# Altium schematic symbol library Schlib.SchLib: 725 symbols (part 1 of 6) (continued)
## 9774060243R
designator RST?  (value not drawn)
Spacer Material: Steel, Tin-Plated Mounting: SMT Series: WA-SMST Thread D: M2; Manufacturer: Wurth Electronics; Manufacturer Part Number: 9774060243R; Plating: Tin; Threaded/Unthreaded: Threaded; Outside Diameter: 0.171inch; Thread Size: M2X0.4; Supplier: Rs; Supplier Part Number: 1768217P; RoHS: Yes; Category: Spacers, Standoffs; Stock: 2290; Pricing: 20=0.59500, 50=0.56700, 100=0.49000, 250=0.46500 (GBP); Material: Steel; Series: WA-SMSI; Length: 0.291inch; ComponentLink1URL: http://www.farnell.com/datasheets/1960376.pdf?src-supplier=Farnell; ComponentLink1Description: http://www.farnell.com/datasheets/1960376.pdf?src-supplier=Farnell; ComponentLink2URL: http://www.mouser.com/ds/2/445/9774060243R-611459.pdf?src-supplier=Mouser; ComponentLink2Description: http://www.mouser.com/ds/2/445/9774060243R-611459.pdf?src-supplier=Mouser; ComponentLink3URL: https://media.digikey.com/pdf/Data%20Sheets/Wurth%20Electronics%20PDFs/WA-SMSx_Performance_Flyer.pdf?src-supplier=Digi-Key; ComponentLink3Description: https://media.digikey.com/pdf/Data%20Sheets/Wurth%20Electronics%20PDFs/WA-SMSx_Performance_Flyer.pdf?src-supplier=Digi-Key; ComponentLink4URL: http://www.farnell.com/datasheets/1960376.pdf?src-supplier=Element14; ComponentLink4Description: http://www.farnell.com/datasheets/1960376.pdf?src-supplier=Element14; ComponentLink5URL: http://www.farnell.com/datasheets/1960376.pdf?src-supplier=Newark; ComponentLink5Description: http://www.farnell.com/datasheets/1960376.pdf?src-supplier=Newark
footprint RST_6mm- M2
pins: 1

## 9774060360R
designator RST?  (value not drawn)
Spacer Material: Steel, Tin-Plated Mounting: SMT Series: WA-SMSI Thread D: M3 / Round Standoff Threaded M3x0.5 Steel 0.236" (6.00mm); Manufacturer: Wurth Electronics; Manufacturer Part Number: 9774060360R; Plating: Tin; Outside Diameter: 0.236inch; Body Length: 6mm; Supplier: Rs; Supplier Part Number: 1768264P; RoHS: Yes; Category: Spacers, Standoffs; Stock: 835; Pricing: 25=1.72400, 50=1.64600, 100=1.56600, 250=1.48600 (GBP); Mounting Technology: External; Material: Steel; Threaded/Unthreaded: Threaded; Series: WA-SMSI; Length: 0.291inch; Width: 6mm; Thread Size: M3; ComponentLink1URL: https://datasheet.ciiva.com/46421/1840149-46421900.pdf?src-supplier=Element14; ComponentLink1Description: https://datasheet.ciiva.com/46421/1840149-46421900.pdf?src-supplier=Element14
footprint RST_6mm
pins: 1

## 9774065151R
designator RST?  (value not drawn)
WA-SMSI SMT Steel Spacer, M2.5 Internal non Stop; Manufacturer: Wurth Electronics; Manufacturer Part Number: 9774065151R; Supplier: Digikey; Supplier Part Number: 732-9774065151RCT-ND; RoHS: No; Category: Spacers, Standoffs; Stock: 1071; Pricing: 1=1.02, 50=0.919, 100=0.856 (USD)
footprint RST_6.5mm- M2
pins: 1

## 61300211121
designator J?  (value not drawn)
Connector Header Through Hole 2 position 0.100 (2.54mm); MF: Wurth Elektronik; MP: 61300211121; SnapEDA_Link: https://www.snapeda.com/parts/61300211121/Wurth+Elektronik/view-part/?ref=snap; Package: None; Value: *; Check_prices: https://www.snapeda.com/parts/61300211121/Wurth+Elektronik/view-part/?ref=eda; Manufacturer Part Number: 61300211121
footprint 61300211121
pins: 01, 02

## 61300411121
designator J?  (value not drawn)
Connector Header Through Hole 4 position 0.100 (2.54mm); MF: Wurth Electronics; MP: 61300411121; Package: None; Price: None; Value: *; SnapEDA_Link: https://www.snapeda.com/parts/61300411121/Wurth+Electronics+Inc./view-part/?ref=snap; Availability: In Stock; Check_prices: https://www.snapeda.com/parts/61300411121/Wurth+Electronics+Inc./view-part/?ref=eda
footprint 61300411121
pins: 1, 2, 3, 4

## 61300511121
designator J?  (value not drawn)
THT Vertical Pin Header WR-PHD, Pitch 2.54 mm, Single Row, 5 pins; Manufacturer: Wurth Electronics; Manufacturer Part Number: 61300511121; Number of Positions: 5; Gender: Male; Contact Resistance: 20mR; Current Rating: 3A; Operating Supply Voltage: 250V; Pitch: 0.1inch; Supplier: Rs; Supplier Part Number: 8281597; RoHS: Yes; Category: Headers and Wire Housings; Stock: 495; Pricing: 5=0.252, 125=0.136, 500=0.116, 2500=0.11, 5000=0.102 (EUR); Mounting Technology: Through Hole; Contact Plating: Gold; Contact Material: Copper; Color: Black; Min Operating Temperature: -40°C; Max Operating Temperature: 105°C; Number of Rows: 1; Packaging: Bulk; Termination: Solder; Number of Contacts: 5; Series: WR-PHD; Contact Type: Male Pin; Orientation: 5495OrientationType; Voltage Rating: 250V; Height: 8.89mm; Contact Mating Length: 0.236inch; Lead Free: Lead Free; RoHS Compliant: Yes; Reach SVHC Compliant: Unknown; ComponentLink1URL: http://www.farnell.com/cad/1737268.pdf?src-supplier=Element14; ComponentLink1Description: http://www.farnell.com/cad/1737268.pdf?src-supplier=Element14; ComponentLink2URL: https://datasheet.octopart.com/61300511121-W%C3%BCrth-Elektronik-datasheet-21154836.pdf?src-supplier=Element14; ComponentLink2Description: https://datasheet.octopart.com/61300511121-W%C3%BCrth-Elektronik-datasheet-21154836.pdf?src-supplier=Element14; ComponentLink3URL: https://katalog.we-online.de/em/datasheet/6130xx11121.pdf?src-supplier=Digikey; ComponentLink3Description: https://katalog.we-online.de/em/datasheet/6130xx11121.pdf?src-supplier=Digikey
footprint 61300511121 (Pin Header, pitch 2.54 mm, THT, Vertical, single row, 5p)
pins: 1, 2, 3, 4, 5

## 61300611121
designator J?  (value not drawn)
THT Vertical Pin Header WR-PHD, Pitch 2.54 mm, Single Row, 6 pins; Manufacturer: Wurth Electronics; Manufacturer Part Number: 61300611121; Current Rating: 3A; Voltage Rating: 250V; Number of Positions: 6; Gender: Male; Contact Resistance: 20mR; Pitch: 0.1inch; Supplier 1: Rs; RoHS: Yes; Category: Headers and Wire Housings; Stock 1: 1345; Pricing 1: 125=0.122, 500=0.118, 2500=0.116, 5000=0.112 (GBP); Mounting Technology: Through Hole; Contact Plating: Gold; Contact Material: Copper Alloy,Copper; Housing Material: PBT; Color: Black; Min Operating Temperature: -40°C; Max Operating Temperature: 125°C; Number of Rows: 1; Contact Gender: Male; Packaging: Bulk; Termination: Through Hole; Number of Contacts: 6; Series: WR-PHD; Contact Type: Male Pin; Operating Supply Voltage: 250V; Orientation: 5495OrientationType; Height: 8.89mm; Contact Mating Length: 0.236inch; Lead Free: Lead Free; RoHS Compliant: Yes; Reach SVHC Compliant: Unknown; ComponentLink1URL: http://www.mouser.com/ds/2/445/6130xx11121-538006.pdf?src-supplier=Mouser; ComponentLink1Description: http://www.mouser.com/ds/2/445/6130xx11121-538006.pdf?src-supplier=Mouser; ComponentLink2URL: http://www.farnell.com/cad/1737268.pdf?src-supplier=Element14; ComponentLink2Description: http://www.farnell.com/cad/1737268.pdf?src-supplier=Element14; ComponentLink3URL: https://datasheet.octopart.com/61300611121-W%C3%BCrth-Elektronik-datasheet-21154836.pdf?src-supplier=Element14; ComponentLink3Description: https://datasheet.octopart.com/61300611121-W%C3%BCrth-Elektronik-datasheet-21154836.pdf?src-supplier=Element14; ComponentLink4URL: https://katalog.we-online.de/em/datasheet/6130xx11121.pdf?src-supplier=Digi-Key; ComponentLink4Description: https://katalog.we-online.de/em/datasheet/6130xx11121.pdf?src-supplier=Digi-Key; Supplier Part Number 1: 8281591P
footprint 61300611121
pins: 1, 2, 3, 4, 5, 6

## 61900411121
designator J?  (value not drawn)
4 Positions Header, Unshrouded Connector 0.100" (2.54mm) Through Hole Tin; Manufacturer: Wurth Electronics; Manufacturer Part Number: 61900411121; Current Rating: 3A; Voltage Rating: 250V; Number of Positions: 4; Insulation: Insulated; Insulation Resistance: 1GR; Gender: Male; Contact Resistance: 20mR; Supplier: Rs; Supplier Part Number: 8281484; RoHS: Yes; Category: Headers and Wire Housings; Stock: 215; Pricing: 5=0.916, 100=0.578, 375=0.548, 1500=0.524, 3000=0.498 (EUR); Mounting Technology: Through Hole; Contact Plating: Tin; Contact Material: Copper Alloy,Copper; Housing Material: Nylon; Contact Shape: Square; Contact Finish - Mating: TIN; Insulation Material: Nylon; Insulation Color: Beige; Min Operating Temperature: -40°C; Max Operating Temperature: 105°C; Number of Rows: 1; Fastening Type: Friction; Packaging: Bulk; Contact Gender: Male; Termination: Through Hole; Number of Contacts: 4; Connector Type: Header; Series: WR-WTB; Contact Type: Male Pin; Operating Supply Voltage: 250V; Orientation: 5495OrientationType; Length: 10.16mm; Width: 10.2mm; Height: 3.3mm; Pitch: 2.54mm; Lead Free: Lead Free; Flammability Rating: UL94 V-0; RoHS Compliant: Yes; Reach SVHC Compliant: Unknown; ComponentLink1URL: https://datasheet.ciiva.com/13678/6190xx11121-265818-13678996.pdf?src-supplier=Mouser; ComponentLink1Description: https://datasheet.ciiva.com/13678/6190xx11121-265818-13678996.pdf?src-supplier=Mouser; ComponentLink2URL: https://datasheet.ciiva.com/738/6190xx11121-738576.pdf?src-supplier=Digikey; ComponentLink2Description: https://datasheet.ciiva.com/738/6190xx11121-738576.pdf?src-supplier=Digikey; ComponentLink3URL: https://datasheet.ciiva.com/7631/1442200-7631333.pdf?src-supplier=Element14; ComponentLink3Description: https://datasheet.ciiva.com/7631/1442200-7631333.pdf?src-supplier=Element14; ComponentLink4URL: https://datasheet.ciiva.com/48700/001088232-da-01-en-wr-wtb-2-54mm-61900411121-48700571.pdf?src-supplier=Conrad; ComponentLink4Description: https://datasheet.ciiva.com/48700/001088232-da-01-en-wr-wtb-2-54mm-61900411121-48700571.pdf?src-supplier=Conrad
footprint 61900411121
pins: 1, 2, 3, 4

## 74279221111
designator FB?
Ferrite Beads Multi-Layer High Current 110Ohm 25% 100MHz 5.4A 0.015Ohm DCR 1206 Automotive T/R; Manufacturer: Wurth Elektronik; Manufacturer Part Number: 74279221111; DC Resistance (DCR): 9.5mΩ; Impedance: 110Ω; Number of Lines: 1; Value: 15mΩ; Supplier: RS; Supplier Part Number: 8630873P; RoHS: Compliant; Category: Ferrite Beads and Chips; Stock: 1470; Pricing: 100=0.324, 500=0.269, 1000=0.257, 3000=0.245 (GBP); Case/Package: 1206; Case Code (Imperial): 1206; Case Code (Metric): 3216; Current Rating: 5.4A; Height: 1.1mm; Length: 3.2mm; Max Current Rating: 5.4A; Max DC Current: 5.4A; Max Operating Temperature: 125°C; Min Operating Temperature: -55°C; Mounting Technology: Surface Mount; Packaging: Tape & Reel (TR); Termination: SMD/SMT; Test Frequency: 100MHz; Tolerance: 25%; Weight: 10.007382mg; Width: 1.6mm; ComponentLink1URL: https://datasheet.octopart.com:443/74279221111-Wurth-Elektronik-datasheet-168487539.pdf?src-supplier=Wurth+Elektronik; ComponentLink1Description: https://datasheet.octopart.com:443/74279221111-Wurth-Elektronik-datasheet-168487539.pdf?src-supplier=Wurth+Elektronik; ComponentLink2URL: https://datasheet.octopart.com:443/74279221111-W%C3%BCrth-Elektronik-datasheet-37143589.pdf?src-supplier=RS+(Formerly+Allied+Electronics); ComponentLink2Description: https://datasheet.octopart.com:443/74279221111-W%C3%BCrth-Elektronik-datasheet-37143589.pdf?src-supplier=RS+(Formerly+Allied+Electronics)
footprint 74279221111
pins: 1, 2

## 74437368100
designator L?  value 10uH  (hidden comment: *)
WE-LHMI; 10000nH; Composite Iron Multilayer SMD Induc.; 1040 Case; .012GHz 5.2A; Manufacturer: Wurth Electronics; Manufacturer Part Number: 74437368100; Core Material: Ferrite,Composite; Saturation Current: 12.5A; Tolerance: 20%; Shielding: Shielded; DC Resistance (DCR): 30mR; Test Frequency: 100kHz; Frequency: 12MHz; Supplier: Rs; Supplier Part Number: 7568639; RoHS: Yes; Category: Fixed Inductors; Stock: 79; Pricing: 1=2.09, 10=2.01, 20=1.92, 50=1.84, 100=1.69 (GBP); Mounting Technology: Surface Mount; Case/Package: Nonstandard; Min Operating Temperature: -40°C; Max Operating Temperature: 125°C; Packaging: Tape and Reel; Max DC Current: 5.2A; Termination: SMD/SMT; Series: WE-LHMI; Package Quantity: 1; Current Rating: 5.2A; Inductance Tolerance: 20%; Self Resonant Frequency: 12MHz; RMS Current (Irms): 5.2A; ESR: 30mR; Length: 11mm; Width: 10mm; Height: 3.8mm; Depth: 10mm; Height - Seated (Max): 0.157inch; RoHS Compliant: Yes; Reach SVHC Compliant: Unknown; ComponentLink1URL: https://datasheet.ciiva.com/7691/1735876-7691599.pdf?src-supplier=Element14; ComponentLink1Description: https://datasheet.ciiva.com/7691/1735876-7691599.pdf?src-supplier=Element14; ComponentLink2URL: https://datasheet.ciiva.com/4961/74437368100-33032-4961278.pdf?src-supplier=Mouser; ComponentLink2Description: https://datasheet.ciiva.com/4961/74437368100-33032-4961278.pdf?src-supplier=Mouser; ComponentLink3URL: https://datasheet.ciiva.com/7354/74437368100-7354467.pdf?src-supplier=Newark; ComponentLink3Description: https://datasheet.ciiva.com/7354/74437368100-7354467.pdf?src-supplier=Newark; ComponentLink4URL: https://datasheet.ciiva.com/1060/74437368100-1060838.pdf?src-supplier=Digikey; ComponentLink4Description: https://datasheet.ciiva.com/1060/74437368100-1060838.pdf?src-supplier=Digikey; ComponentLink5URL: https://datasheet.ciiva.com/48690/001087611-da-01-ml-we-lhmi-smd-speicherdrossel-744373-de-en-48690490.pdf?src-supplier=Conrad; ComponentLink5Description: https://datasheet.ciiva.com/48690/001087611-da-01-ml-we-lhmi-smd-speicherdrossel-744373-de-en-48690490.pdf?src-supplier=Conrad
footprint 74437368100 (Precision Wire Wound Inductor, 2-Leads, Body 10.80x10.16mm, IPC Medium Density)
pins: 1 B, 2 A

## 74438336012
designator L?
Fixed Inductors WE-MAPI SMD 3020 1.2uH 3.9A 36mOhm; Manufacturer: Wurth Elektronik; Manufacturer Part Number: 74438336012; Core Material: Composite, Ferrite, Metal; DC Resistance (DCR): 30mΩ; Value: 1.2µH; Inductance Tolerance: 20%; Saturation Current: 3.05A; Self Resonant Frequency: 57MHz; Shielding: Shielded; Test Frequency: 100kHz; Supplier: RS; Supplier Part Number: 8630801; RoHS: Compliant; Category: Fixed Inductors; Stock: 50; Pricing: 5=1.12, 25=1.064, 50=0.996, 250=0.93, 1000=0.712 (GBP); Ambient Temperature Range High: 85°C; Ambient Temperature Range Low: -40°C; Case/Package: SMD/SMT; Current Rating: 3.9A; Height: 2mm; Height - Seated (Max): 2.0066mm; Length: 3mm; Max DC Current: 3.9A; Max Operating Temperature: 125°C; Min Operating Temperature: -40°C; Mounting Technology: Surface Mount; Pins: 2; REACH SVHC: Unknown; RMS Current (Irms): 3.9A; Termination: SMD/SMT; Tolerance: 20%; Width: 3mm; ComponentLink1URL: https://datasheet.octopart.com:443/74438336012-Wurth-Elektronik-datasheet-168490058.pdf?src-supplier=Wurth+Elektronik; ComponentLink1Description: https://datasheet.octopart.com:443/74438336012-Wurth-Elektronik-datasheet-168490058.pdf?src-supplier=Wurth+Elektronik; ComponentLink2URL: https://datasheet.octopart.com:443/74438336012-W%C3%BCrth-Elektronik-datasheet-32048088.pdf?src-supplier=Newark; ComponentLink2Description: https://datasheet.octopart.com:443/74438336012-W%C3%BCrth-Elektronik-datasheet-32048088.pdf?src-supplier=Newark; ComponentLink3URL: https://datasheet.octopart.com:443/74438336012-W%C3%BCrth-Elektronik-datasheet-111088892.pdf?src-supplier=RS+(Formerly+Allied+Electronics); ComponentLink3Description: https://datasheet.octopart.com:443/74438336012-W%C3%BCrth-Elektronik-datasheet-111088892.pdf?src-supplier=RS+(Formerly+Allied+Electronics)
footprint 74438336012
pins: 1, 2

## 74438336015HT
designator *  value 1.5uH
Power Inductor, 1.5UH, Shielded, 5.2A Rohs Compliant: Yes; Manufacturer: Wurth Elektronik; Manufacturer Part Number: 74438336015HT; Supplier: RS; Supplier Part Number: 219750; Category: Fixed Inductors; Stock: 500; Pricing: 5=1.346, 50=1.278, 100=1.182, 500=1.09, 1000=1.048 (EUR)
footprint 74438336015HT
pins: 1 B, 2 A

## 74438356150
designator L?  value 15uH  (hidden comment: *)
General Purpose Inductor, 15uH, 20%, 1 Element, SMD, 1616; Manufacturer: Wurth Electronics; Manufacturer Part Number: 74438356150; Supplier: Farnell; Supplier Part Number: 2842179; RoHS: Yes; Category: Fixed Inductors; Stock: 719; Pricing: 1=338.96, 50=322.98, 100=299, 250=276.61, 500=257.42, 1000=209.46, 5000=205.28, 10000=201.09 (JPY); ComponentLink1URL: http://www.farnell.com/datasheets/2579563.pdf?src-supplier=Farnell; ComponentLink1Description: http://www.farnell.com/datasheets/2579563.pdf?src-supplier=Farnell; ComponentLink2URL: http://www.farnell.com/datasheets/2579563.pdf?src-supplier=Element14; ComponentLink2Description: http://www.farnell.com/datasheets/2579563.pdf?src-supplier=Element14; ComponentLink3URL: https://katalog.we-online.de/pbs/datasheet/74438356150.pdf?src-supplier=Digikey; ComponentLink3Description: https://katalog.we-online.de/pbs/datasheet/74438356150.pdf?src-supplier=Digikey; ComponentLink4URL: http://www.farnell.com/datasheets/2579563.pdf?src-supplier=Newark; ComponentLink4Description: http://www.farnell.com/datasheets/2579563.pdf?src-supplier=Newark
footprint 74438356150
pins: 1 B, 2 A

## 97730256330R
designator RST?  (value not drawn)
WA-SMSI SMT Steel Spacer, M1.6 Bottom closed; Manufacturer: Wurth Electronics; Manufacturer Part Number: 97730256330R; Supplier: Digikey; Supplier Part Number: 732-13680-1-ND; RoHS: No; Category: Spacers, Standoffs; Stock: 2984; Pricing: 1=0.88, 10=0.81, 50=0.721, 100=0.632, 500=0.588, 1000=0.544 (USD); Min Operating Temperature: -55°C; Max Operating Temperature: 150°C; Packaging: 10Packaging; Length: 2.5mm; Width: 3.3mm; ComponentLink1URL: https://www.we-online.com/catalog/datasheet/97730256330R.pdf?src-supplier=Digikey; ComponentLink1Description: https://www.we-online.com/catalog/datasheet/97730256330R.pdf?src-supplier=Digikey
footprint 97730256330R
pins: 1

## 875105242010
designator C?  value 100uF  (hidden comment: *)
WCAP-PSLP Radial Can - SMD Aluminum Polymer Capacitor 0.197Dia 5.00mm ±20% 100muF 10V; Manufacturer: Wurth Electronics; Manufacturer Part Number: 875105242010; Material: 4242ConductorMaterial; Dissipation Factor: 8%; Leakage Current: 300uA; Pitch: 5.3mm; Supplier: Digikey; Supplier Part Number: 732-6410-1-ND; RoHS: Yes; Category: Polymer Capacitors; Stock: 2301; Pricing: 1=0.6, 50=0.508, 100=0.441, 250=0.392, 500=0.343 (USD); Diameter: 5mm; Length: 5.5mm; Height: 5.5mm; ComponentLink1URL: http://www.farnell.com/datasheets/1880491.pdf?src-supplier=Farnell; ComponentLink1Description: http://www.farnell.com/datasheets/1880491.pdf?src-supplier=Farnell; ComponentLink2URL: http://katalog.we-online.de/pbs/datasheet/875105242010.pdf?src-supplier=Digikey; ComponentLink2Description: http://katalog.we-online.de/pbs/datasheet/875105242010.pdf?src-supplier=Digikey; ComponentLink3URL: https://katalog.we-online.de/pbs/datasheet/875105242010.pdf?src-supplier=Digikey; ComponentLink3Description: https://katalog.we-online.de/pbs/datasheet/875105242010.pdf?src-supplier=Digikey; ComponentLink4URL: http://www.farnell.com/datasheets/1880491.pdf?src-supplier=Newark; ComponentLink4Description: http://www.farnell.com/datasheets/1880491.pdf?src-supplier=Newark; ComponentLink5URL: http://www.farnell.com/datasheets/1880491.pdf?src-supplier=Element14; ComponentLink5Description: http://www.farnell.com/datasheets/1880491.pdf?src-supplier=Element14
footprint 875105242010
pins: 1 B, 2 A

## A768KS567M1CLAE017
designator C?  value 560uF  (hidden comment: *)
Cap Alum Poly 560UF 20% 16V SMD; Manufacturer: KEMET; Manufacturer Part Number: A768KS567M1CLAE017; Supplier: Digi-Key; Supplier Part Number: 399-A768KS567M1CLAE017CT-ND; RoHS: No; Category: Polymer Capacitors; Stock: 776; Pricing: 1=0.98000, 10=0.74500, 50=0.61880, 100=0.53290 (USD)
pins: 1 B, 2 A

## A768MS227M1GLAE022
designator C?  value 220uF  (hidden comment: *)
Cap Aluminum Polymer 220uF 40V 20% Solder Cylindrical 22m Ohm 2200mA 2000 hr 125°C T/R; Manufacturer: KEMET; Manufacturer Part Number: A768MS227M1GLAE022; Supplier: Digi-Key; Supplier Part Number: 399-A768MS227M1GLAE022CT-ND; RoHS: Yes; Category: Polymer Capacitors; Stock: 1465; Pricing: 1=0.97000, 10=0.73900, 50=0.61420, 100=0.52890 (USD)
footprint A768MS227M1GLAE022 (Aluminum Electrolytic Capacitor, Body 10.80x10.30x10.40mm, IPC Low Density)
pins: 1 P, 2 N

## A769KE107M1VLAS031
designator *  value 100 uF
Cap, 100UF, 35V, Alu Elec SMD, Polymer;; Manufacturer: KEMET; Manufacturer Part Number: A769KE107M1VLAS031; Supplier: Digi-Key; Supplier Part Number: 399-A769KE107M1VLAS031CT-ND; RoHS: No; Stock: 3000; Pricing: 1=0.83000, 10=0.61100, 50=0.48920, 100=0.41920, 500=0.33190 (USD)
pins: 1 P, 2 N

## AA3528SECKT09
designator D?  (value not drawn)
3.5X2.8MM Orange SMD Led; Manufacturer: Kingbright; Manufacturer Part Number: AA3528SECKT09; Supplier: Digikey; Supplier Part Number: 754-AA3528SECKT09TR-ND; RoHS: Yes; Category: LEDs; Stock: 13142; Pricing: 1=0.83, 10=0.496, 100=0.3298, 500=0.26448, 1000=0.24444 (USD); ComponentLink1URL: https://www.kingbrightusa.com/images/catalog/SPEC/AA3528SECKT09.pdf; ComponentLink1Description: https://www.kingbrightusa.com/images/catalog/SPEC/AA3528SECKT09.pdf
footprint AA3528SECKT09
pins: 1 C, 2 A

## AA3528ZGCKT09
designator D?  (value not drawn)
3.5X2.8MM Green SMD Led; Manufacturer: Kingbright; Manufacturer Part Number: AA3528ZGCKT09; Supplier: Digikey; Supplier Part Number: 754-AA3528ZGCKT09CT-ND; RoHS: Yes; Category: LEDs; Stock: 13142; Pricing: 1=0.83, 10=0.496, 100=0.3298, 500=0.26448, 1000=0.24444 (USD); ComponentLink1URL: https://datasheet.octopart.com/AA3528ZGCKT09-Kingbright-datasheet-159640635.pdf?src-supplier=Sager+Electronics; ComponentLink1Description: https://datasheet.octopart.com/AA3528ZGCKT09-Kingbright-datasheet-159640635.pdf?src-supplier=Sager+Electronics
footprint AA3528ZGCKT09
pins: 1 C, 2 A

## ABS05-32.768KHZ-T
designator Y?  Frequency: 32.768kHz  (hidden comment: *)
CRYSTAL 32.768kHz ±20ppm Crystal 12.5pF 90 kOhm -40°C ^ 85°C Surface Mount 2-SMD; Manufacturer: Abracon; Manufacturer Part Number: ABS05-32.768KHZ-T; ESR (Equivalent Series Resistance): 90kR; Supplier: Future Electronics; Supplier Part Number: 7024515; RoHS: Yes; Category: Crystals; Stock: 261000; Pricing: 3000=0.415, 6000=0.41, 9000=0.405, 12000=0.4, 15000=0.39 (USD); Mounting Technology: Surface Mount; Case/Package: CSMD; Pins: 2; Min Operating Temperature: -40°C; Max Operating Temperature: 85°C; Packaging: Tape and Reel; Frequency Tolerance: 20ppm; Load Capacitance: 12.5pF; Package Quantity: 3000; Tolerance: 20ppm; Termination: SMD/SMT; ESR: 90kR; Series: ABS05; Operating Frequency: 32.768 kHz; Length: 1.6mm; Width: 1mm; Height: 0.5mm; Depth: 1mm; Radiation Hardening: No; Reach SVHC Compliant: No; Lead Free: Lead Free; RoHS Compliant: Yes; ComponentLink1URL: https://datasheet.ciiva.com/23810/abs05-23810480.pdf?src-supplier=Newark; ComponentLink1Description: https://datasheet.ciiva.com/23810/abs05-23810480.pdf?src-supplier=Newark; ComponentLink2URL: https://datasheet.ciiva.com/6728/abs05-6728949.pdf?src-supplier=Digikey; ComponentLink2Description: https://datasheet.ciiva.com/6728/abs05-6728949.pdf?src-supplier=Digikey; ComponentLink3URL: https://datasheet.ciiva.com/6728/abs05-6728950.pdf?src-supplier=Digikey; ComponentLink3Description: https://datasheet.ciiva.com/6728/abs05-6728950.pdf?src-supplier=Digikey; ComponentLink4URL: https://datasheet.ciiva.com/16411/abs05-16411149.pdf?src-supplier=Future+Electronics; ComponentLink4Description: https://datasheet.ciiva.com/16411/abs05-16411149.pdf?src-supplier=Future+Electronics
footprint ABS05-32.768KHZ-T
pins: 1, 2

## AC0402FR-075R1L
designator R?  value 5.1Ω
Res Thick Film 0402 5.1 Ohm 1% 0.063W(1/16W) ±200ppm/C Pad SMD T/R Automotive AEC-Q200; Manufacturer: Yageo Group; Manufacturer Part Number: AC0402FR-075R1L; Max Power Dissipation: 63mW; Power Dissipation: 62.5mW; Temperature Coefficient: 200ppm/°C; Voltage Rating: 50V; Supplier Part Number: AC0402FR-075R1L; RoHS: Compliant; Category: Chip SMD Resistors; Stock: 210000; Pricing: 10000=0.002 (USD); Case/Package: 0402; China RoHS: Non-Compliant; Composition: Thick Film; Features: Automotive AEC-Q200, Moisture Resistant; Height: 320µm; Length: 990.6µm; Lifecycle Status: Production; Max Operating Temperature: 155°C; Min Operating Temperature: -55°C; Mounting Technology: Surface Mount; Number of Terminals: 2; Number of Terminations: 2; Packaging: Tape & Reel; Power Rating: 62.5mW; REACH SVHC: Yes; Schedule B: 8533210045, 8533210045|8533210045|8533210045|8533210045|8533210045; Tolerance: 1%; Width: 500µm; Working Voltage: 50V; ComponentLink1URL: https://datasheet.octopart.com:443/AC0402FR-075R1L-Yageo-datasheet-182189377.pdf?src-supplier=IHS; ComponentLink1Description: https://datasheet.octopart.com:443/AC0402FR-075R1L-Yageo-datasheet-182189377.pdf?src-supplier=IHS; ComponentLink2URL: https://datasheet.octopart.com:443/AC0402FR-075R1L-Yageo-datasheet-83209224.pdf?src-supplier=Upverter; ComponentLink2Description: https://datasheet.octopart.com:443/AC0402FR-075R1L-Yageo-datasheet-83209224.pdf?src-supplier=Upverter; ComponentLink3URL: https://datasheet.octopart.com:443/AC0402FR-075R1L-Yageo-datasheet-178509465.pdf?src-supplier=Newark; ComponentLink3Description: https://datasheet.octopart.com:443/AC0402FR-075R1L-Yageo-datasheet-178509465.pdf?src-supplier=Newark; ComponentLink4URL: https://datasheet.octopart.com:443/AC0402FR-075R1L-Yageo-datasheet-166720450.pdf?src-supplier=Future+Electronics; ComponentLink4Description: https://datasheet.octopart.com:443/AC0402FR-075R1L-Yageo-datasheet-166720450.pdf?src-supplier=Future+Electronics; ComponentLink5URL: https://datasheet.octopart.com:443/AC0402FR-075R1L-Yageo-Group-datasheet-164768995.pdf?src-supplier=ODG+(Origin+Data+Global); ComponentLink5Description: https://datasheet.octopart.com:443/AC0402FR-075R1L-Yageo-Group-datasheet-164768995.pdf?src-supplier=ODG+(Origin+Data+Global); ComponentLink6URL: https://datasheet.octopart.com/AC0402FR-075R1L-Yageo-datasheet-12512238.pdf; ComponentLink6Description: https://datasheet.octopart.com/AC0402FR-075R1L-Yageo-datasheet-12512238.pdf; ComponentLink7URL: https://datasheet.octopart.com:443/AC0402FR-075R1L-Yageo-datasheet-140571090.pdf?src-supplier=Arrow.cn; ComponentLink7Description: https://datasheet.octopart.com:443/AC0402FR-075R1L-Yageo-datasheet-140571090.pdf?src-supplier=Arrow.cn; ComponentLink8URL: http://sigma.octopart.com:80/conflict_mineral_statement/Yageo-company-3.pdf?src-supplier=Compliance+Statements; ComponentLink8Description: http://sigma.octopart.com:80/conflict_mineral_statement/Yageo-company-3.pdf?src-supplier=Compliance+Statements; ComponentLink9URL: http://sigma.octopart.com:80/rohs_statement/Yageo-company-2.pdf?src-supplier=Compliance+Statements; ComponentLink9Description: http://sigma.octopart.com:80/rohs_statement/Yageo-company-2.pdf?src-supplier=Compliance+Statements; Supplier: Arrow Electronics
footprint R 0402 (1005 Metric) (Chip Capacitor, Body 1.0x0.5mm, IPC High Density)
pins: 1 B, 2 A

## AC0402FR-0752K3L
designator R?  value 52.3kΩ  (hidden comment: *)
Res Thick Film 0402 52.3K Ohm 1% 0.063W(1/16W) ±100ppm/C Pad SMD Automotive T/R; Manufacturer: Yageo Group; Manufacturer Part Number: AC0402FR-0752K3L; Max Power Dissipation: 63mW; Power Dissipation: 62.5mW; Temperature Coefficient: 100ppm/°C; Voltage Rating: 50V; Supplier: Future Electronics; Supplier Part Number: 4184608; RoHS: Compliant; Category: Chip SMD Resistors; Stock: 20000; Pricing: 10000=0.0009, 50000=0.0009, 250000=0.0008, 750000=0.0008, 2000000=0.0008 (USD); Case/Package: 0402; Case Code (Imperial): 0402; Case Code (Metric): 1005; China RoHS: Non-Compliant; Composition: Thick Film; Features: Automotive AEC-Q200, Moisture Resistant; Height: 320µm; Length: 990.6µm; Lifecycle Status: Production; Max Operating Temperature: 155°C; Min Operating Temperature: -55°C; Mounting Technology: Surface Mount; Number of Terminals: 2; Number of Terminations: 2; Packaging: Tape & Reel; Power Rating: 62.5mW; REACH SVHC: Yes; Schedule B: 8533210045, 8533210045|8533210045|8533210045|8533210045|8533210045; Termination: SMD/SMT; Tolerance: 1%; Weight: 652.039032µg; Width: 500µm; Working Voltage: 50V; ComponentLink1URL: https://datasheet.octopart.com:443/AC0402FR-0752K3L-Yageo-datasheet-182189377.pdf?src-supplier=IHS; ComponentLink1Description: https://datasheet.octopart.com:443/AC0402FR-0752K3L-Yageo-datasheet-182189377.pdf?src-supplier=IHS; ComponentLink2URL: https://datasheet.octopart.com:443/AC0402FR-0752K3L-Yageo-datasheet-83209224.pdf?src-supplier=Upverter; ComponentLink2Description: https://datasheet.octopart.com:443/AC0402FR-0752K3L-Yageo-datasheet-83209224.pdf?src-supplier=Upverter; ComponentLink3URL: https://datasheet.octopart.com:443/AC0402FR-0752K3L-Yageo-datasheet-178509465.pdf?src-supplier=element14+APAC; ComponentLink3Description: https://datasheet.octopart.com:443/AC0402FR-0752K3L-Yageo-datasheet-178509465.pdf?src-supplier=element14+APAC; ComponentLink4URL: https://datasheet.octopart.com:443/AC0402FR-0752K3L-Yageo-datasheet-166720450.pdf?src-supplier=Future+Electronics; ComponentLink4Description: https://datasheet.octopart.com:443/AC0402FR-0752K3L-Yageo-datasheet-166720450.pdf?src-supplier=Future+Electronics; ComponentLink5URL: https://datasheet.octopart.com:443/AC0402FR-0752K3L-Yageo-Group-datasheet-164768995.pdf?src-supplier=ODG+(Origin+Data+Global); ComponentLink5Description: https://datasheet.octopart.com:443/AC0402FR-0752K3L-Yageo-Group-datasheet-164768995.pdf?src-supplier=ODG+(Origin+Data+Global); ComponentLink6URL: https://datasheet.octopart.com/AC0402FR-0752K3L-Yageo-datasheet-12512238.pdf; ComponentLink6Description: https://datasheet.octopart.com/AC0402FR-0752K3L-Yageo-datasheet-12512238.pdf; ComponentLink7URL: http://sigma.octopart.com:80/rohs_statement/Yageo-company-2.pdf?src-supplier=Compliance+Statements; ComponentLink7Description: http://sigma.octopart.com:80/rohs_statement/Yageo-company-2.pdf?src-supplier=Compliance+Statements; ComponentLink8URL: http://sigma.octopart.com:80/conflict_mineral_statement/Yageo-company-3.pdf?src-supplier=Compliance+Statements; ComponentLink8Description: http://sigma.octopart.com:80/conflict_mineral_statement/Yageo-company-3.pdf?src-supplier=Compliance+Statements
footprint R 0402 (1005 Metric) (Chip Capacitor, Body 1.0x0.5mm, IPC High Density)
pins: 1 B, 2 A

## ACP3225-102-2P-T000
designator L?  (value not drawn)
ACP Series 1210 1000 Ohm 1.2 A 0.10 Ohm DCR 50 V SMT Common Mode Filter; Manufacturer: TDK; Manufacturer Part Number: ACP3225-102-2P-T000; Number of Lines: 2; Impedance: 1kR; Frequency: 8.5GHz; Voltage Rating: 60V; DC Resistance (DCR): 100mR; Current Rating: 1.5A; DC Current: 1.2A; Test Frequency: 100MHz; Shielding: Shielded; Tolerance: 25%; Value: 4.1uH; Coil Resistance: 50mR; Supplier: Rs; Supplier Part Number: 8319273P; RoHS: Yes; Category: Common Mode Chokes; Stock: 86685; Pricing: 50=0.642, 125=0.506, 250=0.46, 500=0.412 (EUR); Mounting Technology: Surface Mount; Case/Package: 1210; Case Code (Metric): 3225; Case Code (Imperial): 1210; Min Operating Temperature: -40°C; Max Operating Temperature: 85°C; Packaging: Tape and Reel; Package Quantity: 1000; Termination: SMD/SMT; Max DC Current: 1.5A; Series: ACP; Max Current Rating: 1.5A; Voltage Rating (DC): 60V; RMS Current (Irms): 1.5A; ESR: 100mR; Inductance Tolerance: 25%; Length: 3.4mm; Height: 1.9mm; Depth: 2.7mm; Reach SVHC Compliant: No; RoHS Compliant: Yes; Lead Free: 5697LeadFree; ComponentLink1URL: https://datasheet.ciiva.com/4547/tdk-acp3225-series-198430-4547748.pdf?src-supplier=Mouser; ComponentLink1Description: https://datasheet.ciiva.com/4547/tdk-acp3225-series-198430-4547748.pdf?src-supplier=Mouser; ComponentLink2URL: https://datasheet.ciiva.com/6215/acp3225-series-6215985.pdf?src-supplier=Digikey; ComponentLink2Description: https://datasheet.ciiva.com/6215/acp3225-series-6215985.pdf?src-supplier=Digikey; ComponentLink3URL: https://datasheet.ciiva.com/6215/e9713-acp-6215977.pdf?src-supplier=Digikey; ComponentLink3Description: https://datasheet.ciiva.com/6215/e9713-acp-6215977.pdf?src-supplier=Digikey; ComponentLink4URL: https://datasheet.ciiva.com/6215/e9713-acp-6215981.pdf?src-supplier=Digikey; ComponentLink4Description: https://datasheet.ciiva.com/6215/e9713-acp-6215981.pdf?src-supplier=Digikey
footprint ACP3225-102-2P-T000
pins: 1, 2, 3, 4

## ACPL-C79A-500E
designator U?  (value not drawn)
IC ISOLATION AMPLIFIER 8-SOIC; Manufacturer: Broadcom Avago; Manufacturer Part Number: ACPL-C79A-500E; Number of Circuits: 1; Bandwidth: 200kHz; Input Offset Voltage (Vos): 600uV; Operating Supply Current: 13mA; Input Bias Current: 100nA; Output Current per Channel: 11mA; Isolation Voltage: 5kV; Max Supply Voltage: 200mV; Min Supply Voltage: 3V; Voltage: 5V; Supplier: Rs; Supplier Part Number: 1744175; RoHS: Yes; Category: Amplifiers - Op Amps, Buffer, Instrumentation; Stock: 432; Pricing: 2=6.575 (GBP); Mounting Technology: Surface Mount; Case/Package: SOIC; Pins: 8; Contact Plating: Tin,Matte; Min Operating Temperature: -40°C; Max Operating Temperature: 105°C; Packaging: Tape and Reel; Package Quantity: 1000; -3db Bandwidth: 200kHz; Number of Channels: 1; Number of Amplifiers: 1; Series: -; Amplifier Type: ISOLATION; Supply Current: 13mA; Radiation Hardening: No; Reach SVHC Compliant: No; RoHS Compliant: Yes; ComponentLink1URL: https://datasheet.ciiva.com/23616/1639100-23616916.pdf?src-supplier=Newark; ComponentLink1Description: https://datasheet.ciiva.com/23616/1639100-23616916.pdf?src-supplier=Newark; ComponentLink2URL: https://datasheet.ciiva.com/15119/getdatasheetpartid-410217-15119517.pdf?src-supplier=Verical; ComponentLink2Description: https://datasheet.ciiva.com/15119/getdatasheetpartid-410217-15119517.pdf?src-supplier=Verical; ComponentLink3URL: https://datasheet.ciiva.com/46421/1790979-46421143.pdf?src-supplier=Element14; ComponentLink3Description: https://datasheet.ciiva.com/46421/1790979-46421143.pdf?src-supplier=Element14
footprint ACPL-C79A-500E
pins: 1 VDD1, 2 VIN+, 3 VIN-, 4 GND1, 5 GND2, 6 VOUT-, 7 VOUT+, 8 VDD2

## ACS772ECB-200B-PFF-T
designator U?  (value not drawn)
High-Precision Current Sensor IC with 200kHz Bandwidth, Enhanced Accuracy, 100 µΩ Current Conductor and 4.8kV Voltage...; Manufacturer: Allegro MicroSystems; Manufacturer Part Number: ACS772ECB-200B-PFF-T; Sensing Method: Hall Effect; Current Sensing: 200A; Sensitivity: 10mV/A; Linearity: 0.9%; Response Time: 2.5us; Max Supply Current: 15mA; Number of Channels: 1; Supplier: Mouser; Supplier Part Number: 250-772ECB200BPFFT; RoHS: Yes; Category: Current Sensors; Stock: 1330; Pricing: 1=10.36, 10=8.18, 50=7.27, 100=7.27, 1000=5.27, 10000=5.08 (USD); Mounting Technology: Through Hole; Min Operating Temperature: -40°C; Max Operating Temperature: 85°C; Series: Automotive, AEC-Q100; Frequency: 200kHz; RoHS Compliant: Yes
footprint ACS772ECB-200B-PFF-T
pins: 1 VDD, 2 GND, 3 Out, 4 IP+, 5 IP-

## ACS772ECB-300B-PFF-T
designator U?  (value not drawn)
Current Sensor Current Sensor AC/DC Current 5V Automotive 5-Pin Case CB-PFF Tube; Manufacturer: Allegro MicroSystems; Manufacturer Part Number: ACS772ECB-300B-PFF-T; Supplier: Mouser; Supplier Part Number: 250-CS772ECB300BPFFT; RoHS: Yes; Category: Current Sensors
footprint ACS772ECB-300B-PFF-T (+- 300A)
pins: 1 VDD, 2 GND, 3 Out, 4 IP+, 5 IP-

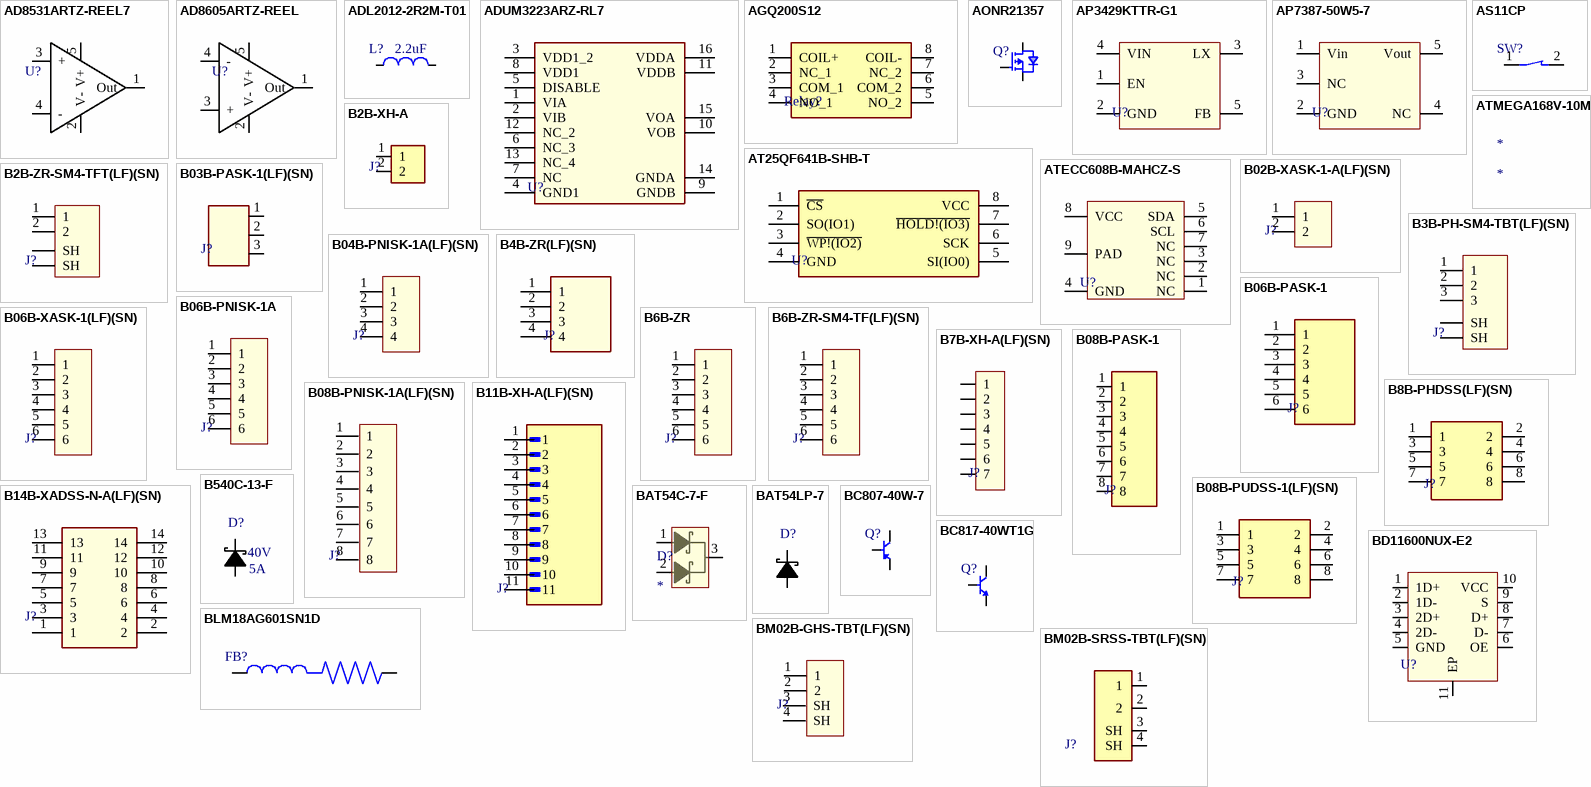
[diagram p5: symbols AD8531ARTZ-REEL7 to BM02B-SRSS-TBT(LF)(SN)]

## AD8531ARTZ-REEL7
designator U?  (value not drawn)
IC, Operational Amplifier, SINGLE, CMOS, TSOP, 5PIN, PLASTIC ; RoHS Compliant: Yes; Manufacturer: Analog Devices; Manufacturer Part Number: AD8531ARTZ-REEL7; Supplier: Mouser; Supplier Part Number: 584-AD8531ARTZ-R7; RoHS: Yes; Category: Amplifiers - Op Amps, Buffer, Instrumentation; Stock: 137809; Pricing: 1=0.97, 10=0.82, 50=0.82, 100=0.627, 1000=0.436, 10000=0.374 (USD); ComponentLink1URL: https://datasheet.ciiva.com/1793/ad8531-8532-8534-1793256.pdf?src-supplier=Digi-Key; ComponentLink1Description: https://datasheet.ciiva.com/1793/ad8531-8532-8534-1793256.pdf?src-supplier=Digi-Key; ComponentLink2URL: https://datasheet.ciiva.com/1793/ad8531-8532-8534-1793257.pdf?src-supplier=Digi-Key; ComponentLink2Description: https://datasheet.ciiva.com/1793/ad8531-8532-8534-1793257.pdf?src-supplier=Digi-Key; ComponentLink3URL: https://datasheet.ciiva.com/1793/ad8531-8532-8534-1793258.pdf?src-supplier=Digi-Key; ComponentLink3Description: https://datasheet.ciiva.com/1793/ad8531-8532-8534-1793258.pdf?src-supplier=Digi-Key; ComponentLink4URL: https://datasheet.ciiva.com/2973/ad8531-8532-8534-2973056.pdf?src-supplier=Avnet; ComponentLink4Description: https://datasheet.ciiva.com/2973/ad8531-8532-8534-2973056.pdf?src-supplier=Avnet; ComponentLink5URL: https://datasheet.ciiva.com/2973/ad8531-8532-8534-2973057.pdf?src-supplier=Avnet; ComponentLink5Description: https://datasheet.ciiva.com/2973/ad8531-8532-8534-2973057.pdf?src-supplier=Avnet; ComponentLink6URL: https://datasheet.ciiva.com/1135/82474-1135580.pdf?src-supplier=Element14; ComponentLink6Description: https://datasheet.ciiva.com/1135/82474-1135580.pdf?src-supplier=Element14; ComponentLink7URL: https://datasheet.ciiva.com/1135/82474-1135581.pdf?src-supplier=Element14; ComponentLink7Description: https://datasheet.ciiva.com/1135/82474-1135581.pdf?src-supplier=Element14
footprint SOT-23-5
pins: 1 Out, 2 V-, 3 +, 4 -, 5 V+

## AD8605ARTZ-REEL
designator U?  (value not drawn)
General Purpose Amplifier 1 Circuit Rail-to-Rail SOT-23-5; Manufacturer: Analog Devices; Manufacturer Part Number: AD8605ARTZ-REEL; Common Mode Rejection Ratio: 85dB; Gain Bandwidth Product: 10MHz; Number of Circuits: 1; Input Capacitance: 8.8pF; Max Supply Voltage: 5.5V; Min Supply Voltage: 2.7V; Voltage Gain: 120dB; Slew Rate: 5V/µs; Input Bias Current: 1pA; Input Offset Voltage (Vos): 300uV; Operating Supply Current: 1.2mA; Output Current per Channel: 80mA; Input Voltage Noise Density: 8nV/sqrt Hz; Power Supply Rejection Ratio (PSRR): 95dB; Settling Time: 1us; Supplier: Mouser; Supplier Part Number: 584-AD8605ARTZ-R; RoHS: Yes; Category: Amplifiers - Op Amps, Buffer, Instrumentation; Stock: 75541; Pricing: 1=2.8, 10=2.52, 50=2.37, 100=2.02, 1000=1.38, 10000=1.26 (USD); Case/Package: SOT-23-5; Pins: 5; Contact Plating: Tin,Matte; Min Operating Temperature: -40°C; Max Operating Temperature: 125°C; Packaging: Tape and Reel; Number of Channels: 1; Unity Gain Bandwidth Product: 10MHz; Package Quantity: 10000; Number of Elements: 1; Quiescent Current: 1.2mA; Number of Amplifiers: 1; Series: DigiTrim®; Amplifier Type: GENERAL PURPOSE; Technology: CMOS; Lead Free: Contains Lead; RoHS Compliant: Yes; ComponentLink1URL: https://datasheet.ciiva.com/2974/ad8605-8606-8608-2974700.pdf?src-supplier=Avnet; ComponentLink1Description: https://datasheet.ciiva.com/2974/ad8605-8606-8608-2974700.pdf?src-supplier=Avnet
footprint SOT-23-5
pins: 1 Out, 2 V-, 3 +, 4 -, 5 V+

## ADL2012-2R2M-T01
designator L?  value 2.2uF  (hidden comment: *)
2.2 µH Unshielded Drum Core, Wirewound Inductor 550 mA 500mOhm Max 0805 (2012 Metric); Manufacturer: TDK; Manufacturer Part Number: ADL2012-2R2M-T01; Supplier: Digi-Key; Supplier Part Number: 445-ADL2012-2R2M-T01CT-ND; RoHS: No; Stock: 6722; Pricing: 1=0.61000, 10=0.53700, 25=0.49840, 50=0.42160, 100=0.38330, 250=0.36028, 500=0.32196, 1000=0.26064 (USD); Case/Package: 0805
footprint ADL2012-2R2M-T01
pins: 1 B, 2 A

## ADUM3223ARZ-RL7
designator U?  (value not drawn)
Driver 4A 2-OUT High and Low Side/Isolated Gate Driver Half Brdg Automotive 16-Pin SOIC N T/R; Manufacturer: Analog Devices; Manufacturer Part Number: ADUM3223ARZ-RL7; Number of Channels: 2; Propagation Delay: 59ns; Min Supply Voltage: 3.3V; Max Supply Voltage: 5V; Supply Current: 870uA; Supplier: Mouser; Supplier Part Number: 584-ADUM3223ARZ-R7; RoHS: Yes; Category: Interface ICs; Stock: 14815; Pricing: 1=6.87, 10=5.17, 50=5.17, 100=4.23, 1000=3.55, 10000=3.55 (USD); Mounting Technology: Surface Mount; Case/Package: SOIC; Pins: 16; Contact Plating: Tin,Matte; Min Operating Temperature: -40°C; Max Operating Temperature: 125°C; Packaging: Tape and Reel; Package Quantity: 1000; Max Output current: 4A; Series: iCoupler®; Lead Free: Contains Lead; RoHS Compliant: Yes; ComponentLink1URL: http://www.mouser.com/ds/2/609/ADuM3223_4223-879059.pdf?src-supplier=Mouser; ComponentLink1Description: http://www.mouser.com/ds/2/609/ADuM3223_4223-879059.pdf?src-supplier=Mouser; ComponentLink2URL: http://www.analog.com/media/en/technical-documentation/data-sheets/ADuM3223_4223.pdf?src-supplier=Digi-Key; ComponentLink2Description: http://www.analog.com/media/en/technical-documentation/data-sheets/ADuM3223_4223.pdf?src-supplier=Digi-Key; ComponentLink3URL: http://www.analog.com/static/imported-files/data_sheets/ADuM3223_4223.pdf?src-supplier=Avnet; ComponentLink3Description: http://www.analog.com/static/imported-files/data_sheets/ADuM3223_4223.pdf?src-supplier=Avnet; ComponentLink4URL: https://www.analog.com/media/en/technical-documentation/data-sheets/ADuM3223_4223.pdf?src-supplier=Digi-Key; ComponentLink4Description: https://www.analog.com/media/en/technical-documentation/data-sheets/ADuM3223_4223.pdf?src-supplier=Digi-Key
footprint ADUM3223ARZ-RL7
pins: 1 VIA, 2 VIB, 3 VDD1_2, 4 GND1, 5 DISABLE, 6 NC_3, 7 NC, 8 VDD1, 9 GNDB, 10 VOB, 11 VDDB, 12 NC_2, 13 NC_4, 14 GNDA, 15 VOA, 16 VDDA

## AGQ200S12
designator Relay?  (value not drawn)
Electromechanical Relay DPDT 2A 12VDC 1.028KOhm Surface Mount; Manufacturer: Panasonic; Manufacturer Part Number: AGQ200S12; Supplier: Mouser; Supplier Part Number: 769-AGQ200S12; RoHS: Yes; Category: Signal Relays; Stock: 369; Pricing: 1=2.97, 10=2.48, 50=2.33, 100=2.23, 1000=1.73, 10000=1.69 (USD); ComponentLink1URL: https://datasheet.ciiva.com/24326/84ds-61008-en-gq-24326925.pdf?src-supplier=Onlinecomponents.com; ComponentLink1Description: https://datasheet.ciiva.com/24326/84ds-61008-en-gq-24326925.pdf?src-supplier=Onlinecomponents.com; ComponentLink2URL: https://datasheet.ciiva.com/1525/1848838-1525208.pdf?src-supplier=Element14; ComponentLink2Description: https://datasheet.ciiva.com/1525/1848838-1525208.pdf?src-supplier=Element14
footprint AGQ200S12Z
pins: 1 COIL+, 2 NC_1, 3 COM_1, 4 NO_1, 5 NO_2, 6 COM_2, 7 NC_2, 8 COIL-

## AONR21357
designator Q?  (value not drawn)
MOSFET P-CH 30V 21A/34A 8DFN
pins: 1 S, 2 S, 3 S, 4 G, 5 D5, 6 D6, 7 D7, 8 D8

## AP3429KTTR-G1
designator U?  (value not drawn)
IC REG BUCK ADJ 2A SYNC TSOT25; Manufacturer: Diodes; Manufacturer Part Number: AP3429KTTR-G1; Supplier: Future Electronics; Supplier Part Number: 5065022; RoHS: Yes; Category: Voltage Regulators - Switching; Stock: 12000; Pricing: 3000=0.111, 9000=0.108, 15000=0.106, 45000=0.103, 75000=0.101 (USD); ComponentLink1URL: https://datasheet.octopart.com/AP3429KTTR-G1-Diodes-Inc.-datasheet-151468546.pdf?src-supplier=Future+Electronics; ComponentLink1Description: https://datasheet.octopart.com/AP3429KTTR-G1-Diodes-Inc.-datasheet-151468546.pdf?src-supplier=Future+Electronics; ComponentLink2URL: https://www.diodes.com/assets/Datasheets/AP3429.pdf?src-supplier=Digi-Key; ComponentLink2Description: https://www.diodes.com/assets/Datasheets/AP3429.pdf?src-supplier=Digi-Key; ComponentLink3URL: http://www.diodes.com/_files/datasheets/AP3429.pdf?src-supplier=Avnet; ComponentLink3Description: http://www.diodes.com/_files/datasheets/AP3429.pdf?src-supplier=Avnet; ComponentLink4URL: https://datasheet.octopart.com/AP3429KTTR-G1-Diodes-Inc.-datasheet-83159299.pdf?src-supplier=SHENGYU+ELECTRONICS; ComponentLink4Description: https://datasheet.octopart.com/AP3429KTTR-G1-Diodes-Inc.-datasheet-83159299.pdf?src-supplier=SHENGYU+ELECTRONICS
footprint SOT-23-5
pins: 1 EN, 2 GND, 3 LX, 4 VIN, 5 FB

## AP7387-50W5-7
designator U?  (value not drawn)
LDO Regulator Pos 5V 0.15A 5-Pin SOT-25 T/R; Manufacturer: Diodes; Manufacturer Part Number: AP7387-50W5-7; Number of Channels: 1NUMBER; Supplier: Digikey; Supplier Part Number: 31-AP7387-50W5-7CT-ND; RoHS: No; Category: Uncategorized; Stock: 1625; Pricing: 1=0.61, 10=0.533, 25=0.5008, 100=0.4088, 250=0.37976, 500=0.3232, 1000=0.25856 (USD); Output Voltage: 5V
footprint SOT-23-5
pins: 1 Vin, 2 GND, 3 NC, 4 NC, 5 Vout

## AS11CP
designator SW?  (value not drawn)
Switch Slide ON None OFF SPST Top Slide 0.1A 28VAC 28VDC 0.4VA 50000Cycles PC Pins Thru-Hole; Manufacturer: NKK Switches; Manufacturer Part Number: AS11CP; Supplier: Arrow Electronics; Supplier Part Number: AS11CP; RoHS: Yes; Category: Slide Switches; Stock: 3; Pricing: 1=0.8509 (USD); ComponentLink1URL: https://datasheet.ciiva.com/15184/getdatasheetpartid-419364-15184190.pdf?src-supplier=Verical; ComponentLink1Description: https://datasheet.ciiva.com/15184/getdatasheetpartid-419364-15184190.pdf?src-supplier=Verical; ComponentLink2URL: https://datasheet.ciiva.com/2889/aslides-2889263.pdf?src-supplier=Digikey; ComponentLink2Description: https://datasheet.ciiva.com/2889/aslides-2889263.pdf?src-supplier=Digikey; ComponentLink3URL: https://datasheet.ciiva.com/16355/aslides-16355691.pdf?src-supplier=Future+Electronics; ComponentLink3Description: https://datasheet.ciiva.com/16355/aslides-16355691.pdf?src-supplier=Future+Electronics; ComponentLink4URL: https://datasheet.ciiva.com/28376/1784494-28376491.pdf?src-supplier=Element14; ComponentLink4Description: https://datasheet.ciiva.com/28376/1784494-28376491.pdf?src-supplier=Element14; ComponentLink5URL: https://datasheet.ciiva.com/17094/70192625-17094855.pdf?src-supplier=Allied+Electronics; ComponentLink5Description: https://datasheet.ciiva.com/17094/70192625-17094855.pdf?src-supplier=Allied+Electronics
footprint AS11CP (Footprint not found)
pins: 1, 2